# Altium footprint library eagle_tubes_v6.PCBLIB: 18 footprints (part 1 of 2)
Each footprint in its own frame and in the unit in brackets; x right, y up, seen from the top. Pads: shape width x height; smd on the part's side, far side on the other; paste and mask are expansions set on the pad; w line width, h text height; cw(c..) or ccw(c..) is an arc to the next point about the centre after c.
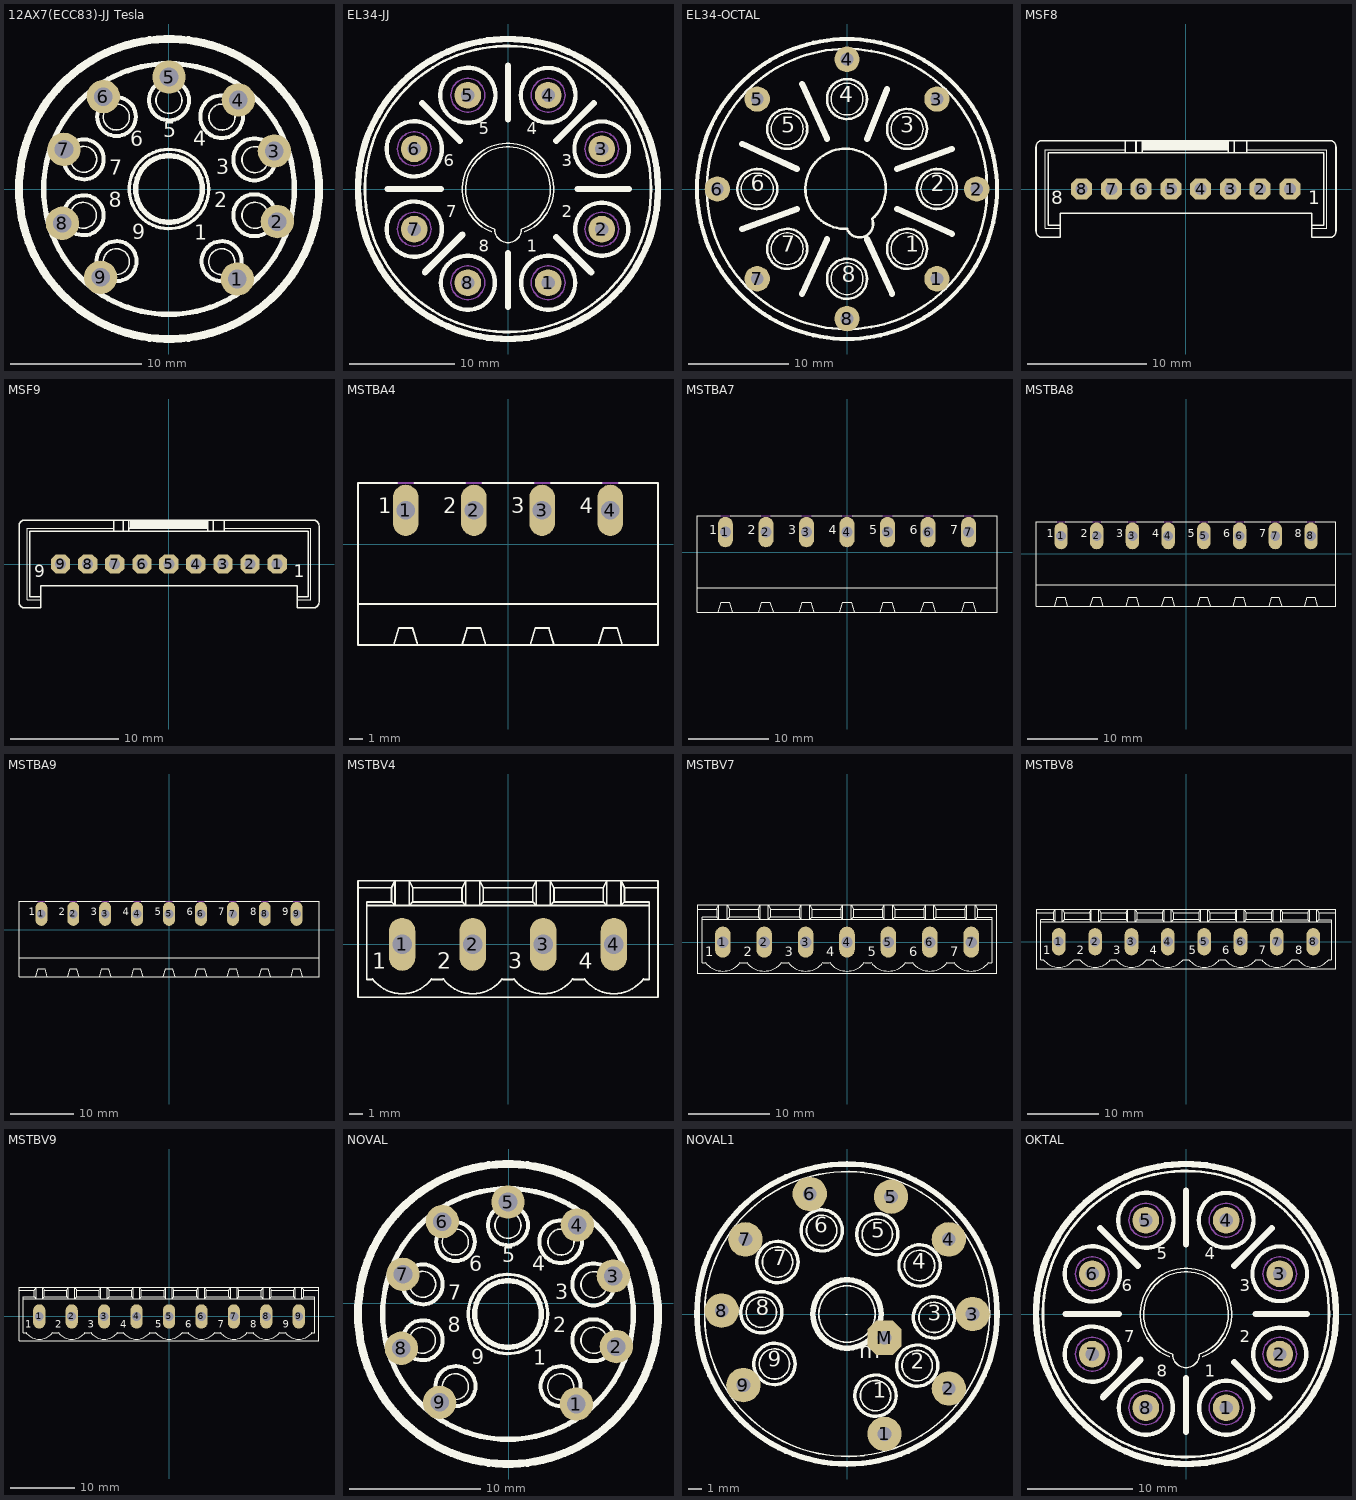
[diagram p0: the footprints below, top view; thin cyan lines are the x and y axes]

## 12AX7(ECC83)-JJ Tesla [mil] "JJ Tesla 12AX7"
height 2559.06
pads (9):
  round 100 hole 56: 1(205.43,-269.97) 2(325.43,-97.76) 3(316.43,114.03) 4(208.43,267.03) 5(0.43,336.03) 6(-196.57,277.03) 7(-314.68,119.03) 8(-319.53,-102.76) 9(-204.57,-264.97)
Top Overlay:
  circle w16: c0.43,0.03 r376
  circle w16: c0.43,0.03 r100
  circle w24: c0.43,0.03 r450
  circle w5: c-255.57,89.03 r39
  circle w5: c-256.57,-78.97 r39
  circle w5: c-157.57,-217.97 r39
  circle w5: c158.43,-217.97 r39
  circle w5: c258.43,-78.97 r39
  circle w5: c258.43,88.03 r39
  circle w5: c159.43,216.03 r39
  circle w5: c0.43,266.03 r39
  circle w5: c-157.57,216.03 r39
  circle w12: c256.43,89.03 r63
  circle w12: c158.43,217.03 r64
  circle w12: c0.43,266.03 r60
  circle w12: c-157.05,217.03 r58
  circle w12: c-255.47,89.03 r60
  circle w12: c256.43,-78.71 r63
  circle w12: c158.43,-216.5 r60
  circle w12: c-157.05,-216.5 r60
  circle w12: c-255.47,-78.71 r60
  circle w10: c0.43,0.03 r119
  text "1" at 76.43,-166.97 h77.5
  text "2" at 135.43,-69.97 h77.5
  text "3" at 142.43,29.03 h77.5
  text "4" at 72.43,115.03 h77.5
  text "5" at -16.57,141.03 h77.5
  text "6" at -116.57,113.03 h77.5
  text "7" at -178.57,28.03 h77.5
  text "8" at -180.57,-68.97 h77.5
  text "9" at -109.57,-165.97 h77.5
3D body: height 210.78, standoff -2303.3, extent -440.77,-430.15 428.7,436.39

## EL34-JJ [mil]
pads (8):
  round 100 hole 50: 1(150,-350) 2(350,-150) 3(350,150) 4(150,350) 5(-150,350) 6(-350,150) 7(-350,-150) 8(-150,-350)
Top Overlay:
  circle w24: c0,0 r560
  circle w16: c-350,150 r103
  circle w16: c-150,350 r103
  circle w16: c150,350 r102
  circle w16: c350,150 r102
  circle w16: c350,-150 r99
  circle w16: c150,-350 r101
  circle w16: c-150,-350 r101
  circle w16: c-350,-150 r103
  circle w10: c0,0 r534
  lines w5: -60,-160 cw(c0,0) 60,-160 ; -50,-150 cw(c0,0) 50,-150 cw(c0,-150) -50,-150
  lines w24: -450,0 -250,0 ; -320,320 -180,180 ; -310,-310 -170,-170 ; 0,-440 0,-240 ; 0,260 0,460 ; 180,-180 310,-310 ; 180,180 320,320 ; 260,0 450,0
  text "1" at 70,-250 h77.5
  text "2" at 200,-120 h77.5
  text "3" at 200,70 h77.5
  text "4" at 70,190 h77.5
  text "5" at -110,190 h77.5
  text "6" at -240,70 h77.5
  text "7" at -230,-120 h77.5
  text "8" at -110,-250 h77.5
Mechanical 4:
  circle w5: c-150,-350 r63
  circle w5: c150,-350 r63
  circle w5: c350,-150 r63
  circle w5: c350,150 r63
  circle w5: c150,350 r63
  circle w5: c-150,350 r63
  circle w5: c-350,150 r63
  circle w5: c-350,-150 r63
3D body: height 4640.1, standoff -159, extent -846.46,-631.61 846.45,631.79

## EL34-OCTAL [mil] "JJ EL34 Octal base Power Tube"
pads (8):
  round 100 hole 50: 1(355,-354.33) 2(512,0) 3(355,355) 4(0,512) 5(-354.33,355) 6(-511.81,0) 7(-354.33,-354.33) 8(0,-511.81)
Top Overlay:
  circle w16: c0,0 r592
  circle w10: c0,0 r553
  circle w10: c-354.33,0 r79
  circle w10: c355,0 r79
  circle w10: c0,-354.33 r79
  circle w10: c0,355 r79
  circle w10: c-236.22,-236.22 r79
  circle w10: c-236.22,237 r79
  circle w10: c237,237 r79
  circle w10: c237,-236.22 r79
  circle w5: c-236.22,237 r63
  circle w5: c0,355 r63
  circle w5: c237,237 r63
  circle w5: c355,0 r63
  circle w5: c237,-236.22 r63
  circle w5: c0,-354.33 r63
  circle w5: c-236.22,-236.22 r63
  circle w5: c-354.33,0 r63
  lines w10: 0,-157.48 cw(c-5.62,0.8) 99,-118.11 cw(c49.5,-137.8) 0,-157.48
  lines w24: -413.39,-157.48 -196.85,-78.74 ; -413.39,178 -196.85,79 ; -177.17,-413.39 -78.74,-196.85 ; -177.17,414 -78.74,197 ; 79,-196.85 178,-413.39 ; 79,197 158,394 ; 197,-78.74 414,-177.17 ; 197,79 414,158
  text "1" at 230,-270 h108.5
  text "2" at 330,-30 h108.5
  text "3" at 210,200 h108.5
  text "4" at -30,320 h108.5
  text "5" at -260,200 h108.5
  text "6" at -380,-30 h108.5
  text "7" at -260,-270 h108.5
  text "8" at -20,-390 h108.5
3D body: height 4620.42, standoff -178.69, extent -807.09,-641.55 885.82,621.85

## MSF8 [mil]
pads (8):
  oct 70x70 hole 40: 1(345,0) 2(246,0) 3(148,0) 4(49,0) 5(-49,0) 6(-148,0) 7(-246,0) 8(-345,0)
Top Overlay:
  rectangle: -142,130 138,160
  lines w0: -416,-130 -466,-130 -466,130 -200,130 ; 201,130 467,130 467,-130 417,-130
  lines w5: -416,-120 -416,-80 417,-80 417,-120 ; -416,-120 -416,-130 -416,-160 -476,-160 cw(c-476,-140) -496,-140 -496,140 cw(c-476,140) -476,160 -200,160 ; -416,-120 -456,-120 -456,120 -200,120 ; -200,120 -200,130 -200,160 ; -200,120 -165,120 ; -200,160 -165,160 ; -165,120 -145,120 ; -165,120 -165,160 ; -165,160 -145,160 ; -145,120 141,120 ; -145,120 -145,130 ; -145,130 141,130 ; -145,130 -145,160 ; -145,160 141,160 ; 141,120 141,130 ; 141,120 161,120 ; 141,130 141,160 ; 141,160 161,160 ; 161,120 201,120 ; 161,120 161,160 ; 161,160 201,160 ; 201,120 201,130 201,160 ; 201,120 457,120 457,-120 417,-120 ; 201,160 477,160 cw(c477,140) 497,140 497,-140 cw(c477,-140) 477,-160 417,-160 417,-130 417,-120
  text "8" at -445,-65 h77.5
  text "1" at 405,-65 h77.5
Mechanical 16:
  lines w5: -360,-15 -330,15 ; -360,-15 -360,15 ; -360,-15 -330,-15 ; -360,15 -330,-15 ; -360,15 -330,15 ; -330,-15 -330,15 ; -261,-15 -231,-15 ; -261,-15 -231,15 ; -261,-15 -261,15 ; -261,15 -231,-15 ; -261,15 -231,15 ; -231,-15 -231,15 ; -163,-15 -133,15 ; -163,-15 -163,15 ; -163,-15 -133,-15 ; -163,15 -133,-15 ; -163,15 -133,15 ; -133,-15 -133,15 ; -64,-15 -34,15 ; -64,-15 -64,15 ; -64,-15 -34,-15 ; -64,15 -34,-15 ; -64,15 -34,15 ; -34,-15 -34,15 ; 34,-15 64,-15 ; 34,-15 34,15 ; 34,-15 64,15 ; 34,15 64,15 ; 34,15 64,-15 ; 64,-15 64,15 ; 133,-15 133,15 ; 133,-15 163,-15 ; 133,-15 163,15 ; 133,15 163,15 ; 133,15 163,-15 ; 163,-15 163,15 ; 231,-15 261,15 ; 231,-15 261,-15 ; 231,-15 231,15 ; 231,15 261,-15 ; 231,15 261,15 ; 261,-15 261,15 ; 330,-15 360,15 ; 330,-15 330,15 ; 330,-15 360,-15 ; 330,15 360,-15 ; 330,15 360,15 ; 360,-15 360,15

## MSF9 [mil]
pads (9):
  oct 70x70 hole 40: 1(394,0) 2(295,0) 3(197,0) 4(98,0) 5(0,0) 6(-98,0) 7(-197,0) 8(-295,0) 9(-394,0)
Top Overlay:
  rectangle: -142,130 138,160
  lines w0: -465,-130 -515,-130 -515,130 -200,130 ; 201,130 516,130 516,-130 466,-130
  lines w5: -465,-120 -465,-80 466,-80 466,-120 ; -465,-120 -465,-130 -465,-160 -525,-160 cw(c-525,-140) -545,-140 -545,140 cw(c-525,140) -525,160 -200,160 ; -465,-120 -505,-120 -505,120 -200,120 ; -200,120 -200,130 -200,160 ; -200,120 -165,120 ; -200,160 -165,160 ; -165,120 -145,120 ; -165,120 -165,160 ; -165,160 -145,160 ; -145,120 141,120 ; -145,120 -145,130 ; -145,130 141,130 ; -145,130 -145,160 ; -145,160 141,160 ; 141,120 141,130 ; 141,120 161,120 ; 141,130 141,160 ; 141,160 161,160 ; 161,120 201,120 ; 161,120 161,160 ; 161,160 201,160 ; 201,120 201,130 201,160 ; 201,120 506,120 506,-120 466,-120 ; 201,160 526,160 cw(c526,140) 546,140 546,-140 cw(c526,-140) 526,-160 466,-160 466,-130 466,-120
  text "9" at -490,-65 h77.5
  text "1" at 455,-65 h77.5
Mechanical 16:
  lines w5: -409,-15 -379,15 ; -409,-15 -409,15 ; -409,-15 -379,-15 ; -409,15 -379,-15 ; -409,15 -379,15 ; -379,-15 -379,15 ; -310,-15 -280,-15 ; -310,-15 -280,15 ; -310,-15 -310,15 ; -310,15 -280,-15 ; -310,15 -280,15 ; -280,-15 -280,15 ; -212,-15 -182,15 ; -212,-15 -212,15 ; -212,-15 -182,-15 ; -212,15 -182,-15 ; -212,15 -182,15 ; -182,-15 -182,15 ; -113,-15 -83,15 ; -113,-15 -113,15 ; -113,-15 -83,-15 ; -113,15 -83,-15 ; -113,15 -83,15 ; -83,-15 -83,15 ; -15,-15 15,-15 ; -15,-15 -15,15 ; -15,-15 15,15 ; -15,15 15,15 ; -15,15 15,-15 ; 15,-15 15,15 ; 83,-15 83,15 ; 83,-15 113,-15 ; 83,-15 113,15 ; 83,15 113,15 ; 83,15 113,-15 ; 113,-15 113,15 ; 182,-15 212,15 ; 182,-15 212,-15 ; 182,-15 182,15 ; 182,15 212,-15 ; 182,15 212,15 ; 212,-15 212,15 ; 280,-15 310,15 ; 280,-15 280,15 ; 280,-15 310,-15 ; 280,15 310,-15 ; 280,15 310,15 ; 310,-15 310,15 ; 379,-15 409,-15 ; 379,-15 409,15 ; 379,-15 379,15 ; 379,15 409,-15 ; 379,15 409,15 ; 409,-15 409,15

## MSTBA4 [mil]
pads (4):
  oval 75x150 hole 55: 1(-300,100) 2(-100,100) 3(100,100) 4(300,100)
Top Overlay:
  lines w5: -325,180 -440,180 -440,-175 ; -275,180 -125,180 ; -75,180 75,180 ; 125,180 275,180 ; 325,180 440,180 440,-175 ; -440,-175 -440,-295 -335,-295 ; -440,-175 440,-175 ; -335,-295 -265,-295 ; -335,-295 -320,-245 -280,-245 -265,-295 ; -265,-295 -135,-295 ; -135,-295 -65,-295 ; -135,-295 -120,-245 -80,-245 -65,-295 ; -65,-295 65,-295 ; 65,-295 80,-245 120,-245 135,-295 ; 65,-295 135,-295 ; 135,-295 265,-295 ; 265,-295 280,-245 320,-245 335,-295 ; 265,-295 335,-295 ; 335,-295 440,-295 440,-175
  text "4" at 210,75 h77.5
  text "3" at 10,75 h77.5
  text "2" at -190,75 h77.5
  text "1" at -380,75 h77.5
Mechanical 16:
  lines w5: -325,180 -275,180 ; -125,180 -75,180 ; 75,180 125,180 ; 275,180 325,180

## MSTBA7 [mil]
pads (7):
  oval 75x150 hole 55: 1(-600,100) 2(-400,100) 3(-200,100) 4(0,100) 5(200,100) 6(400,100) 7(600,100)
Top Overlay:
  lines w5: -625,180 -740,180 -740,-175 ; -575,180 -425,180 ; -375,180 -225,180 ; -175,180 -25,180 ; 25,180 175,180 ; 225,180 375,180 ; 425,180 575,180 ; 625,180 740,180 740,-175 ; -740,-175 -740,-295 -635,-295 ; -740,-175 740,-175 ; -635,-295 -565,-295 ; -635,-295 -620,-245 -580,-245 -565,-295 ; -565,-295 -435,-295 ; -435,-295 -365,-295 ; -435,-295 -420,-245 -380,-245 -365,-295 ; -365,-295 -235,-295 ; -235,-295 -220,-245 -180,-245 -165,-295 ; -235,-295 -165,-295 ; -165,-295 -35,-295 ; -35,-295 -20,-245 20,-245 35,-295 ; -35,-295 35,-295 ; 35,-295 165,-295 ; 165,-295 180,-245 220,-245 235,-295 ; 165,-295 235,-295 ; 235,-295 365,-295 ; 365,-295 380,-245 420,-245 435,-295 ; 365,-295 435,-295 ; 435,-295 565,-295 ; 565,-295 580,-245 620,-245 635,-295 ; 565,-295 635,-295 ; 635,-295 740,-295 740,-175
  text "7" at 510,75 h77.5
  text "6" at 310,75 h77.5
  text "5" at 110,75 h77.5
  text "4" at -90,75 h77.5
  text "3" at -290,75 h77.5
  text "2" at -490,75 h77.5
  text "1" at -680,75 h77.5
Mechanical 16:
  lines w5: -625,180 -575,180 ; -425,180 -375,180 ; -225,180 -175,180 ; -25,180 25,180 ; 175,180 225,180 ; 375,180 425,180 ; 575,180 625,180

## MSTBA8 [mil]
pads (8):
  oval 75x150 hole 55: 1(-700,100) 2(-500,100) 3(-300,100) 4(-100,100) 5(100,100) 6(300,100) 7(500,100) 8(700,100)
Top Overlay:
  lines w5: -725,180 -840,180 -840,-175 ; -675,180 -525,180 ; -475,180 -325,180 ; -275,180 -125,180 ; -75,180 75,180 ; 125,180 275,180 ; 325,180 475,180 ; 525,180 675,180 ; 725,180 840,180 840,-175 ; -840,-175 840,-175 ; -840,-175 -840,-295 -735,-295 ; -735,-295 -720,-245 -680,-245 -665,-295 ; -735,-295 -665,-295 ; -665,-295 -535,-295 ; -535,-295 -520,-245 -480,-245 -465,-295 ; -535,-295 -465,-295 ; -465,-295 -335,-295 ; -335,-295 -265,-295 ; -335,-295 -320,-245 -280,-245 -265,-295 ; -265,-295 -135,-295 ; -135,-295 -65,-295 ; -135,-295 -120,-245 -80,-245 -65,-295 ; -65,-295 65,-295 ; 65,-295 135,-295 ; 65,-295 80,-245 120,-245 135,-295 ; 135,-295 265,-295 ; 265,-295 335,-295 ; 265,-295 280,-245 320,-245 335,-295 ; 335,-295 465,-295 ; 465,-295 535,-295 ; 465,-295 480,-245 520,-245 535,-295 ; 535,-295 665,-295 ; 665,-295 735,-295 ; 665,-295 680,-245 720,-245 735,-295 ; 735,-295 840,-295 840,-175
  text "1" at -780,75 h77.5
  text "2" at -590,75 h77.5
  text "3" at -390,75 h77.5
  text "4" at -190,75 h77.5
  text "5" at 10,75 h77.5
  text "6" at 210,75 h77.5
  text "7" at 410,75 h77.5
  text "8" at 610,75 h77.5
Mechanical 16:
  lines w5: -725,180 -675,180 ; -525,180 -475,180 ; -325,180 -275,180 ; -125,180 -75,180 ; 75,180 125,180 ; 275,180 325,180 ; 475,180 525,180 ; 675,180 725,180

## MSTBA9 [mil]
pads (9):
  oval 75x150 hole 55: 1(-800,100) 2(-600,100) 3(-400,100) 4(-200,100) 5(0,100) 6(200,100) 7(400,100) 8(600,100) 9(800,100)
Top Overlay:
  lines w5: -825,180 -940,180 -940,-175 ; -775,180 -625,180 ; -575,180 -425,180 ; -375,180 -225,180 ; -175,180 -25,180 ; 25,180 175,180 ; 225,180 375,180 ; 425,180 575,180 ; 625,180 775,180 ; 825,180 940,180 940,-175 ; -940,-175 -940,-295 -835,-295 ; -940,-175 940,-175 ; -835,-295 -765,-295 ; -835,-295 -820,-245 -780,-245 -765,-295 ; -765,-295 -635,-295 ; -635,-295 -565,-295 ; -635,-295 -620,-245 -580,-245 -565,-295 ; -565,-295 -435,-295 ; -435,-295 -420,-245 -380,-245 -365,-295 ; -435,-295 -365,-295 ; -365,-295 -235,-295 ; -235,-295 -220,-245 -180,-245 -165,-295 ; -235,-295 -165,-295 ; -165,-295 -35,-295 ; -35,-295 -20,-245 20,-245 35,-295 ; -35,-295 35,-295 ; 35,-295 165,-295 ; 165,-295 180,-245 220,-245 235,-295 ; 165,-295 235,-295 ; 235,-295 365,-295 ; 365,-295 380,-245 420,-245 435,-295 ; 365,-295 435,-295 ; 435,-295 565,-295 ; 565,-295 580,-245 620,-245 635,-295 ; 565,-295 635,-295 ; 635,-295 765,-295 ; 765,-295 780,-245 820,-245 835,-295 ; 765,-295 835,-295 ; 835,-295 940,-295 940,-175
  text "9" at 710,75 h77.5
  text "8" at 510,75 h77.5
  text "7" at 310,75 h77.5
  text "6" at 110,75 h77.5
  text "5" at -90,75 h77.5
  text "4" at -290,75 h77.5
  text "3" at -490,75 h77.5
  text "2" at -690,75 h77.5
  text "1" at -880,75 h77.5
Mechanical 16:
  lines w5: -825,180 -775,180 ; -625,180 -575,180 ; -425,180 -375,180 ; -225,180 -175,180 ; -25,180 25,180 ; 175,180 225,180 ; 375,180 425,180 ; 575,180 625,180 ; 775,180 825,180

## MSTBV4 [mil]
pads (4):
  oval 75x150 hole 55: 1(-300,0) 2(-100,0) 3(100,0) 4(300,0)
Top Overlay:
  lines w5: -384,-98 ccw(c-300,-35) -300,-140 ccw(c-300,-35) -216,-98 ; -383,-100 -400,-100 -400,110 ; -215,-100 -185,-100 ; -184,-98 ccw(c-100,-35) -100,-140 ccw(c-100,-35) -16,-98 ; -15,-100 15,-100 ; 16,-98 ccw(c100,-35) 100,-140 ccw(c100,-35) 184,-98 ; 185,-100 215,-100 ; 216,-98 ccw(c300,-35) 300,-140 ccw(c300,-35) 384,-98 ; 383,-100 400,-100 400,110 ; -425,160 -330,160 ; -425,160 -425,-150 425,-150 425,160 ; -425,160 -425,180 -320,180 ; -400,110 -320,110 ; -400,110 -400,120 -330,120 ; -330,120 -320,110 ; -330,120 -330,160 ; -330,160 -320,180 ; -320,110 -320,180 ; -320,110 -280,110 ; -320,180 -280,180 ; -280,110 -270,120 ; -280,110 -280,180 ; -280,110 -120,110 ; -280,180 -270,160 ; -280,180 -120,180 ; -270,120 -270,160 ; -270,120 -130,120 ; -270,160 -130,160 ; -130,120 -120,110 ; -130,120 -130,160 ; -130,160 -120,180 ; -120,110 -120,180 ; -120,110 -80,110 ; -120,180 -80,180 ; -80,110 -70,120 ; -80,110 -80,180 ; -80,110 80,110 ; -80,180 -70,160 ; -80,180 80,180 ; -70,120 -70,160 ; -70,120 70,120 ; -70,160 70,160 ; 70,120 80,110 ; 70,120 70,160 ; 70,160 80,180 ; 80,110 80,180 ; 80,110 120,110 ; 80,180 120,180 ; 120,110 130,120 ; 120,110 120,180 ; 120,110 280,110 ; 120,180 130,160 ; 120,180 280,180 ; 130,120 270,120 ; 130,120 130,160 ; 130,160 270,160 ; 270,120 280,110 ; 270,120 270,160 ; 270,160 280,180 ; 280,110 280,180 ; 280,110 320,110 ; 280,180 320,180 ; 320,110 330,120 ; 320,110 320,180 ; 320,110 400,110 ; 320,180 330,160 ; 320,180 425,180 425,160 ; 330,120 330,160 ; 330,120 400,120 400,110 ; 330,160 425,160
  text "4" at 200,-85 h77.5
  text "3" at 0,-85 h77.5
  text "2" at -200,-85 h77.5
  text "1" at -385,-85 h77.5
Mechanical 16:
  lines w5: -325,-25 -275,25 ; -325,-25 -275,-25 ; -325,-25 -325,25 ; -325,25 -275,-25 ; -325,25 -275,25 ; -275,-25 -275,25 ; -125,-25 -75,25 ; -125,-25 -125,25 ; -125,-25 -75,-25 ; -125,25 -75,-25 ; -125,25 -75,25 ; -75,-25 -75,25 ; 75,-25 125,25 ; 75,-25 125,-25 ; 75,-25 75,25 ; 75,25 125,-25 ; 75,25 125,25 ; 125,-25 125,25 ; 275,-25 325,-25 ; 275,-25 325,25 ; 275,-25 275,25 ; 275,25 325,-25 ; 275,25 325,25 ; 325,-25 325,25

## MSTBV7 [mil]
pads (7):
  oval 75x150 hole 55: 1(-600,0) 2(-400,0) 3(-200,0) 4(0,0) 5(200,0) 6(400,0) 7(600,0)
Top Overlay:
  lines w5: -684,-98 ccw(c-600,-35) -600,-140 ccw(c-600,-35) -516,-98 ; -683,-100 -700,-100 -700,110 ; -515,-100 -485,-100 ; -484,-98 ccw(c-400,-35) -400,-140 ccw(c-400,-35) -316,-98 ; -315,-100 -285,-100 ; -284,-98 ccw(c-200,-35) -200,-140 ccw(c-200,-35) -116,-98 ; -115,-100 -85,-100 ; -84,-98 ccw(c0,-35) 0,-140 ccw(c0,-35) 84,-98 ; 85,-100 115,-100 ; 116,-98 ccw(c200,-35) 200,-140 ccw(c200,-35) 284,-98 ; 285,-100 315,-100 ; 316,-98 ccw(c400,-35) 400,-140 ccw(c400,-35) 484,-98 ; 485,-100 515,-100 ; 516,-98 ccw(c600,-35) 600,-140 ccw(c600,-35) 684,-98 ; 683,-100 700,-100 700,110 ; -725,160 -725,180 -620,180 ; -725,160 -725,-150 725,-150 725,160 ; -725,160 -630,160 ; -700,110 -700,120 -630,120 ; -700,110 -620,110 ; -630,120 -630,160 ; -630,120 -620,110 ; -630,160 -620,180 ; -620,110 -580,110 ; -620,110 -620,180 ; -620,180 -580,180 ; -580,110 -420,110 ; -580,110 -580,180 ; -580,110 -570,120 ; -580,180 -420,180 ; -580,180 -570,160 ; -570,120 -430,120 ; -570,120 -570,160 ; -570,160 -430,160 ; -430,120 -430,160 ; -430,120 -420,110 ; -430,160 -420,180 ; -420,110 -380,110 ; -420,110 -420,180 ; -420,180 -380,180 ; -380,110 -220,110 ; -380,110 -380,180 ; -380,110 -370,120 ; -380,180 -220,180 ; -380,180 -370,160 ; -370,120 -230,120 ; -370,120 -370,160 ; -370,160 -230,160 ; -230,120 -230,160 ; -230,120 -220,110 ; -230,160 -220,180 ; -220,110 -180,110 ; -220,110 -220,180 ; -220,180 -180,180 ; -180,110 -20,110 ; -180,110 -180,180 ; -180,110 -170,120 ; -180,180 -20,180 ; -180,180 -170,160 ; -170,120 -170,160 ; -170,120 -30,120 ; -170,160 -30,160 ; -30,120 -30,160 ; -30,120 -20,110 ; -30,160 -20,180 ; -20,110 20,110 ; -20,110 -20,180 ; -20,180 20,180 ; 20,110 180,110 ; 20,110 20,180 ; 20,110 30,120 ; 20,180 180,180 ; 20,180 30,160 ; 30,120 170,120 ; 30,120 30,160 ; 30,160 170,160 ; 170,120 170,160 ; 170,120 180,110 ; 170,160 180,180 ; 180,110 220,110 ; 180,110 180,180 ; 180,180 220,180 ; 220,110 380,110 ; 220,110 220,180 ; 220,110 230,120 ; 220,180 380,180 ; 220,180 230,160 ; 230,120 370,120 ; 230,120 230,160 ; 230,160 370,160 ; 370,120 370,160 ; 370,120 380,110 ; 370,160 380,180 ; 380,110 420,110 ; 380,110 380,180 ; 380,180 420,180 ; 420,110 580,110 ; 420,110 420,180 ; 420,110 430,120 ; 420,180 580,180 ; 420,180 430,160 ; 430,120 570,120 ; 430,120 430,160 ; 430,160 570,160 ; 570,120 570,160 ; 570,120 580,110 ; 570,160 580,180 ; 580,110 620,110 ; 580,110 580,180 ; 580,180 620,180 ; 620,110 700,110 ; 620,110 620,180 ; 620,110 630,120 ; 620,180 725,180 725,160 ; 620,180 630,160 ; 630,120 700,120 700,110 ; 630,120 630,160 ; 630,160 725,160
  text "1" at -685,-85 h77.5
  text "2" at -500,-85 h77.5
  text "3" at -300,-85 h77.5
  text "4" at -100,-85 h77.5
  text "5" at 100,-85 h77.5
  text "6" at 300,-85 h77.5
  text "7" at 500,-85 h77.5
Mechanical 16:
  lines w5: -625,-25 -625,25 ; -625,-25 -575,-25 ; -625,-25 -575,25 ; -625,25 -575,25 ; -625,25 -575,-25 ; -575,-25 -575,25 ; -425,-25 -375,-25 ; -425,-25 -425,25 ; -425,-25 -375,25 ; -425,25 -375,25 ; -425,25 -375,-25 ; -375,-25 -375,25 ; -225,-25 -225,25 ; -225,-25 -175,-25 ; -225,-25 -175,25 ; -225,25 -175,25 ; -225,25 -175,-25 ; -175,-25 -175,25 ; -25,-25 -25,25 ; -25,-25 25,25 ; -25,-25 25,-25 ; -25,25 25,25 ; -25,25 25,-25 ; 25,-25 25,25 ; 175,-25 225,-25 ; 175,-25 175,25 ; 175,-25 225,25 ; 175,25 225,25 ; 175,25 225,-25 ; 225,-25 225,25 ; 375,-25 375,25 ; 375,-25 425,-25 ; 375,-25 425,25 ; 375,25 425,25 ; 375,25 425,-25 ; 425,-25 425,25 ; 575,-25 575,25 ; 575,-25 625,-25 ; 575,-25 625,25 ; 575,25 625,25 ; 575,25 625,-25 ; 625,-25 625,25

## MSTBV8 [mil]
pads (8):
  oval 75x150 hole 55: 1(-700,0) 2(-500,0) 3(-300,0) 4(-100,0) 5(100,0) 6(300,0) 7(500,0) 8(700,0)
Top Overlay:
  lines w5: -784,-98 ccw(c-700,-35) -700,-140 ccw(c-700,-35) -616,-98 ; -783,-100 -800,-100 -800,110 ; -615,-100 -585,-100 ; -584,-98 ccw(c-500,-35) -500,-140 ccw(c-500,-35) -416,-98 ; -415,-100 -385,-100 ; -384,-98 ccw(c-300,-35) -300,-140 ccw(c-300,-35) -216,-98 ; -215,-100 -185,-100 ; -184,-98 ccw(c-100,-35) -100,-140 ccw(c-100,-35) -16,-98 ; -17,-100 17,-100 ; 16,-98 ccw(c100,-35) 100,-140 ccw(c100,-35) 184,-98 ; 185,-100 215,-100 ; 216,-98 ccw(c300,-35) 300,-140 ccw(c300,-35) 384,-98 ; 385,-100 415,-100 ; 416,-98 ccw(c500,-35) 500,-140 ccw(c500,-35) 584,-98 ; 585,-100 615,-100 ; 616,-98 ccw(c700,-35) 700,-140 ccw(c700,-35) 784,-98 ; 783,-100 800,-100 800,110 ; -825,160 -825,180 -720,180 ; -825,160 -825,-150 825,-150 825,160 ; -825,160 -730,160 ; -800,110 -800,120 -730,120 ; -800,110 -720,110 ; -730,120 -730,160 ; -730,120 -720,110 ; -730,160 -720,180 ; -720,110 -680,110 ; -720,110 -720,180 ; -720,180 -680,180 ; -680,110 -520,110 ; -680,110 -680,180 ; -680,110 -670,120 ; -680,180 -520,180 ; -680,180 -670,160 ; -670,120 -530,120 ; -670,120 -670,160 ; -670,160 -530,160 ; -530,120 -530,160 ; -530,120 -520,110 ; -530,160 -520,180 ; -520,110 -480,110 ; -520,110 -520,180 ; -520,180 -480,180 ; -480,110 -320,110 ; -480,110 -480,180 ; -480,110 -470,120 ; -480,180 -320,180 ; -480,180 -470,160 ; -470,120 -330,120 ; -470,120 -470,160 ; -470,160 -330,160 ; -330,120 -330,160 ; -330,120 -320,110 ; -330,160 -320,180 ; -320,110 -280,110 ; -320,110 -320,180 ; -320,180 -280,180 ; -280,110 -120,110 ; -280,110 -280,180 ; -280,110 -270,120 ; -280,180 -120,180 ; -280,180 -270,160 ; -270,120 -270,160 ; -270,120 -130,120 ; -270,160 -130,160 ; -130,120 -130,160 ; -130,120 -120,110 ; -130,160 -120,180 ; -120,110 -80,110 ; -120,110 -120,180 ; -120,180 -80,180 ; -80,110 -80,180 ; -80,110 -70,120 ; -80,110 80,110 ; -80,180 -70,160 ; -80,180 80,180 ; -70,120 -70,160 ; -70,120 70,120 ; -70,160 70,160 ; 70,120 70,160 ; 70,120 80,110 ; 70,160 80,180 ; 80,110 120,110 ; 80,110 80,180 ; 80,180 120,180 ; 120,110 280,110 ; 120,110 120,180 ; 120,110 130,120 ; 120,180 280,180 ; 120,180 130,160 ; 130,120 270,120 ; 130,120 130,160 ; 130,160 270,160 ; 270,120 270,160 ; 270,120 280,110 ; 270,160 280,180 ; 280,110 320,110 ; 280,110 280,180 ; 280,180 320,180 ; 320,110 480,110 ; 320,110 320,180 ; 320,110 330,120 ; 320,180 480,180 ; 320,180 330,160 ; 330,120 470,120 ; 330,120 330,160 ; 330,160 470,160 ; 470,120 470,160 ; 470,120 480,110 ; 470,160 480,180 ; 480,110 520,110 ; 480,110 480,180 ; 480,180 520,180 ; 520,110 680,110 ; 520,110 520,180 ; 520,110 530,120 ; 520,180 680,180 ; 520,180 530,160 ; 530,120 530,160 ; 530,120 670,120 ; 530,160 670,160 ; 670,120 670,160 ; 670,120 680,110 ; 670,160 680,180 ; 680,110 720,110 ; 680,110 680,180 ; 680,180 720,180 ; 720,110 800,110 ; 720,110 720,180 ; 720,110 730,120 ; 720,180 825,180 825,160 ; 720,180 730,160 ; 730,120 800,120 800,110 ; 730,120 730,160 ; 730,160 825,160
  text "1" at -785,-85 h77.5
  text "2" at -600,-85 h77.5
  text "3" at -400,-85 h77.5
  text "4" at -200,-85 h77.5
  text "5" at 15,-85 h77.5
  text "6" at 200,-85 h77.5
  text "7" at 400,-85 h77.5
  text "8" at 600,-85 h77.5
Mechanical 16:
  lines w5: -725,-25 -725,25 ; -725,-25 -675,-25 ; -725,-25 -675,25 ; -725,25 -675,25 ; -725,25 -675,-25 ; -675,-25 -675,25 ; -525,-25 -475,-25 ; -525,-25 -525,25 ; -525,-25 -475,25 ; -525,25 -475,25 ; -525,25 -475,-25 ; -475,-25 -475,25 ; -325,-25 -325,25 ; -325,-25 -275,-25 ; -325,-25 -275,25 ; -325,25 -275,25 ; -325,25 -275,-25 ; -275,-25 -275,25 ; -125,-25 -125,25 ; -125,-25 -75,25 ; -125,-25 -75,-25 ; -125,25 -75,25 ; -125,25 -75,-25 ; -75,-25 -75,25 ; 75,-25 75,25 ; 75,-25 125,-25 ; 75,-25 125,25 ; 75,25 125,25 ; 75,25 125,-25 ; 125,-25 125,25 ; 275,-25 325,-25 ; 275,-25 275,25 ; 275,-25 325,25 ; 275,25 325,25 ; 275,25 325,-25 ; 325,-25 325,25 ; 475,-25 475,25 ; 475,-25 525,-25 ; 475,-25 525,25 ; 475,25 525,25 ; 475,25 525,-25 ; 525,-25 525,25 ; 675,-25 675,25 ; 675,-25 725,25 ; 675,-25 725,-25 ; 675,25 725,25 ; 675,25 725,-25 ; 725,-25 725,25

## MSTBV9 [mil]
pads (9):
  oval 75x150 hole 55: 1(-800,0) 2(-600,0) 3(-400,0) 4(-200,0) 5(0,0) 6(200,0) 7(400,0) 8(600,0) 9(800,0)
Top Overlay:
  drawing of 167 lines, arcs and shapes, not listed
  text "9" at 700,-85 h77.5
  text "8" at 500,-85 h77.5
  text "7" at 300,-85 h77.5
  text "6" at 100,-85 h77.5
  text "5" at -85,-85 h77.5
  text "4" at -300,-85 h77.5
  text "3" at -500,-85 h77.5
  text "2" at -700,-85 h77.5
  text "1" at -885,-85 h77.5
Mechanical 16:
  lines w5: -825,-25 -775,25 ; -825,-25 -775,-25 ; -825,-25 -825,25 ; -825,25 -775,-25 ; -825,25 -775,25 ; -775,-25 -775,25 ; -625,-25 -575,25 ; -625,-25 -625,25 ; -625,-25 -575,-25 ; -625,25 -575,-25 ; -625,25 -575,25 ; -575,-25 -575,25 ; -425,-25 -375,25 ; -425,-25 -375,-25 ; -425,-25 -425,25 ; -425,25 -375,-25 ; -425,25 -375,25 ; -375,-25 -375,25 ; -225,-25 -175,-25 ; -225,-25 -175,25 ; -225,-25 -225,25 ; -225,25 -175,-25 ; -225,25 -175,25 ; -175,-25 -175,25 ; -25,-25 25,25 ; -25,-25 25,-25 ; -25,-25 -25,25 ; -25,25 25,-25 ; -25,25 25,25 ; 25,-25 25,25 ; 175,-25 225,25 ; 175,-25 175,25 ; 175,-25 225,-25 ; 175,25 225,-25 ; 175,25 225,25 ; 225,-25 225,25 ; 375,-25 425,25 ; 375,-25 425,-25 ; 375,-25 375,25 ; 375,25 425,-25 ; 375,25 425,25 ; 425,-25 425,25 ; 575,-25 625,-25 ; 575,-25 625,25 ; 575,-25 575,25 ; 575,25 625,-25 ; 575,25 625,25 ; 625,-25 625,25 ; 775,-25 825,25 ; 775,-25 825,-25 ; 775,-25 775,25 ; 775,25 825,-25 ; 775,25 825,25 ; 825,-25 825,25

## NOVAL [mil] "9 Pin small tube pcb socket"
height 551.18
pads (9):
  round 100 hole 56: 1(202.48,-303) 2(322.48,-130.8) 3(313.48,81) 4(205.48,234) 5(-2.52,303) 6(-199.53,244) 7(-317.64,86) 8(-322.48,-135.8) 9(-207.52,-298)
Top Overlay:
  circle w10: c-2.52,-33 r119
  circle w12: c-258.43,-111.74 r60
  circle w12: c-160,-249.54 r60
  circle w12: c155.48,-249.54 r60
  circle w12: c253.48,-111.74 r63
  circle w12: c-258.43,56 r60
  circle w12: c-160,184 r58
  circle w12: c-2.52,233 r60
  circle w12: c155.48,184 r64
  circle w12: c253.48,56 r63
  circle w5: c-160.52,183 r39
  circle w5: c-2.52,233 r39
  circle w5: c156.48,183 r39
  circle w5: c255.48,55 r39
  circle w5: c255.48,-112 r39
  circle w5: c155.48,-251 r39
  circle w5: c-160.52,-251 r39
  circle w5: c-259.52,-112 r39
  circle w5: c-258.52,56 r39
  circle w24: c-2.52,-33 r450
  circle w16: c-2.52,-33 r100
  circle w16: c-2.52,-33 r376
  text "9" at -112.52,-199 h77.5
  text "8" at -183.52,-102 h77.5
  text "7" at -181.52,-5 h77.5
  text "6" at -119.52,80 h77.5
  text "5" at -19.52,108 h77.5
  text "4" at 69.48,82 h77.5
  text "3" at 139.48,-4 h77.5
  text "2" at 132.48,-103 h77.5
  text "1" at 73.48,-200 h77.5
3D body: height 504.79, standoff -186.16, extent -596.73,-624.75 593.4,570.23

## NOVAL1 [mil]
pads (10):
  round 100 hole 40: 1(109,-348.43) 2(296,-216.54) 3(365,0) 4(296,217) 5(128,341) 6(-108.27,349) 7(-295.28,217) 8(-364.17,10) 9(-301.18,-206.69)
  oct 100x100 hole 40: M(109,-68.9)
Top Overlay:
  circle w5: c0,0 r82
  circle w5: c0,0 r414
  circle w5: c-210.91,-145.2 r44
  circle w5: c83,-237.24 r44
  circle w5: c204,-150.04 r44
  circle w5: c253,-10 r44
  circle w5: c211,141 r44
  circle w5: c88,232 r44
  circle w5: c-73.58,243 r44
  circle w5: c-201.97,151 r44
  circle w5: c-249.06,5 r44
  circle w10: c-73.58,243 r60
  circle w10: c88,232 r60
  circle w10: c211,141 r60
  circle w10: c253,-10 r60
  circle w10: c204,-150.04 r60
  circle w10: c83,-237.24 r60
  circle w10: c-210.91,-145.2 r60
  circle w10: c-249.06,5 r60
  circle w10: c-201.97,151 r60
  circle w16: c0,0 r99
  circle w16: c0,0 r436
  lines w0: -3.94,0 0,0
  text "m" at 35,-145 h77.5
  text "9" at -230,-170 h77.5
  text "8" at -265,-20 h77.5
  text "7" at -215,125 h77.5
  text "6" at -95,220 h77.5
  text "5" at 70,205 h77.5
  text "4" at 190,115 h77.5
  text "3" at 235,-35 h77.5
  text "2" at 185,-175 h77.5
  text "1" at 75,-260 h77.5

## OKTAL [mil]
pads (8):
  round 100 hole 50: 1(150,-350) 2(350,-150) 3(350,150) 4(150,350) 5(-150,350) 6(-350,150) 7(-350,-150) 8(-150,-350)
Top Overlay:
  circle w10: c0,0 r534
  circle w16: c-350,-150 r103
  circle w16: c-150,-350 r101
  circle w16: c150,-350 r101
  circle w16: c350,-150 r99
  circle w16: c350,150 r102
  circle w16: c150,350 r102
  circle w16: c-150,350 r103
  circle w16: c-350,150 r103
  circle w24: c0,0 r560
  lines w5: -60,-160 cw(c0,0) 60,-160 ; -50,-150 ccw(c0,-150) 50,-150 ccw(c0,0) -50,-150
  lines w24: -450,0 -250,0 ; -320,320 -180,180 ; -310,-310 -170,-170 ; 0,-440 0,-240 ; 0,260 0,460 ; 180,-180 310,-310 ; 180,180 320,320 ; 260,0 450,0
  text "8" at -110,-250 h77.5
  text "7" at -230,-120 h77.5
  text "6" at -240,70 h77.5
  text "5" at -110,190 h77.5
  text "4" at 70,190 h77.5
  text "3" at 200,70 h77.5
  text "2" at 200,-120 h77.5
  text "1" at 70,-250 h77.5
Mechanical 4:
  circle w5: c-350,-150 r63
  circle w5: c-350,150 r63
  circle w5: c-150,350 r63
  circle w5: c150,350 r63
  circle w5: c350,150 r63
  circle w5: c350,-150 r63
  circle w5: c150,-350 r63
  circle w5: c-150,-350 r63
3D body: height 657.48, standoff -287.4, extent -578.9,-578.9 578.9,578.9